# Altium footprint library SWARMUS_LIB.PcbLib: 114 footprints (part 8 of 8)
Each footprint in its own frame and in the unit in brackets; x right, y up, seen from the top. Pads: shape width x height; smd on the part's side, far side on the other; paste and mask are expansions set on the pad; w line width, h text height; cw(c..) or ccw(c..) is an arc to the next point about the centre after c.
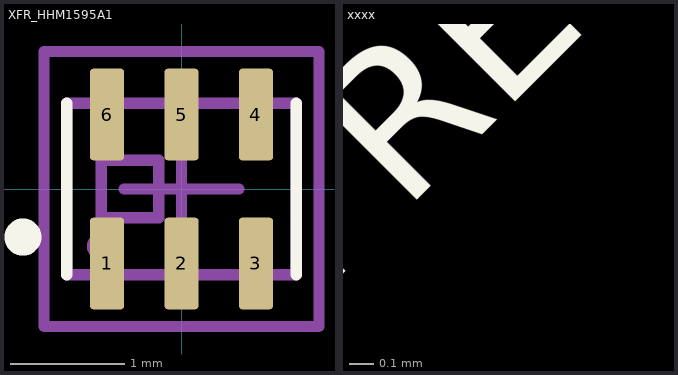
[diagram p7: the footprints below, top view; thin cyan lines are the x and y axes]

## XFR_HHM1595A1 [mm] "HHM1595A1"
height 0.95
pads (6):
  rrect20% 0.3x0.8 smd paste-0.025 mask+0.07: 1(-0.65,-0.65) 2(0,-0.65) 3(0.65,-0.65) 4(0.65,0.65) 5(0,0.65) 6(-0.65,0.65)
Top Overlay:
  circle w0.254: c-1.384,-0.419 r0.034
  lines w0.1: -1,-0.75 -1,0.75 ; 1,-0.75 1,0.75
Top Assembly Drawing:
  circle w0.15: c-0.7,-0.5 r0.05
  lines w0.1: -0.2,-0.25 -0.7,-0.25 -0.7,0.25 -0.2,0.25 -0.2,-0.225 ; -1,-0.75 1,-0.75 1,0.75 -1,0.75 -1,-0.75
Top Courtyard:
  lines w0.1: -0.5,0 0.5,0 ; 0,-0.5 0,0.5 ; -1.2,-1.2 -1.2,1.2 1.2,1.2 1.2,-1.2 -1.2,-1.2
3D body: height 0.95, standoff 0, extent -1,-0.75 1,0.75

## xxxx [mm]
Top Overlay:
  text "PRELIMINARY" at -2.464,-2.997 h1.25